# Altium footprint library ref-packages-longpad.PCBLIB: 1527 footprints (part 28 of 103)
Each footprint in its own frame and in the unit in brackets; x right, y up, seen from the top. Pads: shape width x height; smd on the part's side, far side on the other; paste and mask are expansions set on the pad; w line width, h text height; cw(c..) or ccw(c..) is an arc to the next point about the centre after c.
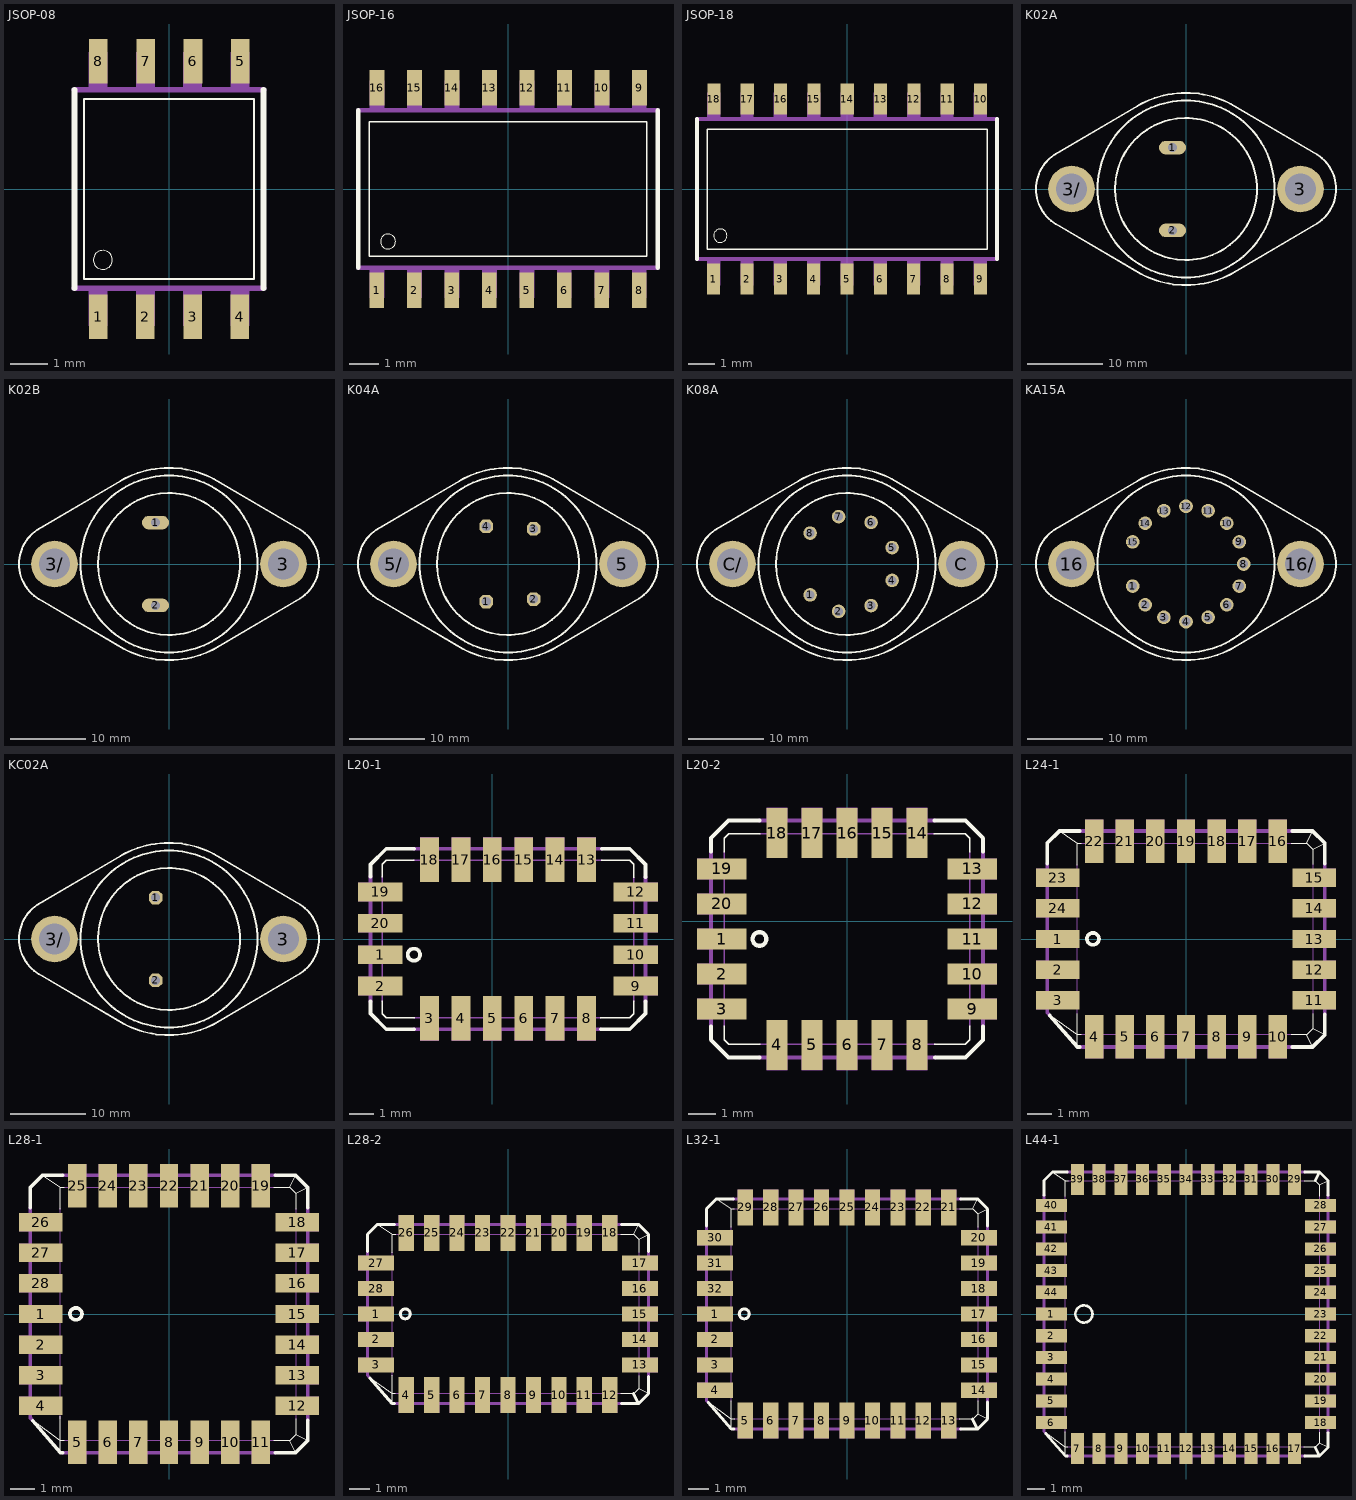
[diagram p27: the footprints below, top view; thin cyan lines are the x and y axes]

## JSOP-08 [mil]
pads (8):
  rect 19.69x47.24 smd: 1(-75,-135) 2(-25,-135) 3(25,-135) 4(75,-135) 5(75.32,135) 6(25.32,135) 7(-24.69,135) 8(-74.69,135)
Top Overlay:
  circle w0: c-70,-75 r10
  lines w2: -90,-95 90,-95 90,95 -90,95 -90,-95
  lines w6: -100,-105 -100,105 ; 100,-105 100,105
Mechanical 16:
  rectangle: -85,105 -65,145
  rectangle: -35,105 -15,145
  rectangle: 15,105 35,145
  rectangle: 65,105 85,145
  rectangle: -85,-145 -65,-105
  rectangle: -35,-145 -15,-105
  rectangle: 15,-145 35,-105
  rectangle: 65,-145 85,-105
  lines w6: -100,-105 100,-105 ; -100,105 100,105

## JSOP-16 [mil]
pads (16):
  rect 19.69x47.24 smd: 1(-175,-135) 2(-125,-135) 3(-75,-135) 4(-25,-135) 5(25,-135) 6(75,-135) 7(125,-135) 8(175,-135) 9(175.32,135) 10(125.32,135) 11(75.32,135) 12(25.32,135) 13(-24.69,135) 14(-74.69,135) 15(-124.69,135) 16(-174.69,135)
Top Overlay:
  circle w0: c-160,-70 r10
  lines w2: -185,-90 185,-90 185,90 -185,90 -185,-90
  lines w6: -200,-105 -200,105 ; 200,-105 200,105
Mechanical 16:
  rectangle: -185,105 -165,145
  rectangle: -135,105 -115,145
  rectangle: -85,105 -65,145
  rectangle: -35,105 -15,145
  rectangle: 15,105 35,145
  rectangle: 65,105 85,145
  rectangle: 115,105 135,145
  rectangle: 165,105 185,145
  rectangle: -185,-145 -165,-105
  rectangle: -135,-145 -115,-105
  rectangle: -85,-145 -65,-105
  rectangle: -35,-145 -15,-105
  rectangle: 15,-145 35,-105
  rectangle: 65,-145 85,-105
  rectangle: 115,-145 135,-105
  rectangle: 165,-145 185,-105
  lines w6: -200,-105 200,-105 ; -200,105 200,105

## JSOP-18 [mil]
pads (18):
  rect 19.69x47.24 smd: 1(-200,-135) 2(-150,-135) 3(-100,-135) 4(-50,-135) 5(0,-135) 6(50,-135) 7(100,-135) 8(150,-135) 9(200,-135) 10(200.32,135) 11(150.32,135) 12(100.32,135) 13(50.32,135) 14(0.32,135) 15(-49.69,135) 16(-99.69,135) 17(-149.69,135) 18(-199.69,135)
Top Overlay:
  circle w0: c-190,-70 r10
  lines w2: -210,-90 210,-90 210,90 -210,90 -210,-90
  lines w6: -225,-105 -225,105 ; 225,-105 225,105
Mechanical 16:
  rectangle: -210,105 -190,145
  rectangle: -160,105 -140,145
  rectangle: -110,105 -90,145
  rectangle: -60,105 -40,145
  rectangle: -10,105 10,145
  rectangle: 40,105 60,145
  rectangle: 90,105 110,145
  rectangle: 140,105 160,145
  rectangle: 190,105 210,145
  rectangle: -210,-145 -190,-105
  rectangle: -160,-145 -140,-105
  rectangle: -110,-145 -90,-105
  rectangle: -60,-145 -40,-105
  rectangle: -10,-145 10,-105
  rectangle: 40,-145 60,-105
  rectangle: 90,-145 110,-105
  rectangle: 140,-145 160,-105
  rectangle: 190,-145 210,-105
  lines w6: -225,-105 225,-105 ; -225,105 225,105

## K02A [mil]
pads (4):
  oval 141x70.5 hole 47: 1(-70,215) 2(-70,-215)
  round 243 hole 162: 3(595,0) 3/(-595,0)
Top Overlay:
  circle w10: c0,0 r369
  circle w10: c0,0 r460
  lines w10: -680,180 -250,433 ; -679,-181 -234,-442 ; -675.41,-183.35 cw(c-567,0) -780,0 cw(c-567,0) -672.94,184.78 ; -250.86,432.52 cw(c-0.01,0) 0,500 cw(c0.01,-0.01) 235.3,441.18 ; -235.3,-441.18 ccw(c-0.01,0.01) 0,-500 ccw(c0.01,0) 250.86,-432.52 ; 235,441 684,178 ; 251,-433 684,-178 ; 682.54,-178.94 ccw(c567,0) 780,0 ccw(c567,0) 682.54,178.94
Mechanical 16:
  circle w10: c595,0 r85
  circle w10: c-595,0 r85

## K02B [mil]
pads (4):
  oval 141x70.5 hole 47: 1(-70,215) 2(-70,-215)
  round 243 hole 162: 3(595,0) 3/(-595,0)
Top Overlay:
  circle w10: c0,0 r369
  circle w10: c0,0 r460
  lines w10: -680,180 -250,433 ; -679,-181 -234,-442 ; -675.41,-183.35 cw(c-567,0) -780,0 cw(c-567,0) -672.94,184.78 ; -250.86,432.52 cw(c-0.01,0) 0,500 cw(c0.01,-0.01) 235.3,441.18 ; -235.3,-441.18 ccw(c-0.01,0.01) 0,-500 ccw(c0.01,0) 250.86,-432.52 ; 235,441 684,178 ; 251,-433 684,-178 ; 682.54,-178.94 ccw(c567,0) 780,0 ccw(c567,0) 682.54,178.94
Mechanical 16:
  circle w10: c595,0 r85
  circle w10: c-595,0 r85

## K04A [mil]
pads (6):
  oct 70.5x70.5 hole 47: 1(-113.17,-195.75) 2(132.8,-183) 3(132.8,183) 4(-113.17,195.75)
  round 243 hole 162: 5(595,0) 5/(-595,0)
Top Overlay:
  circle w10: c0,0 r369
  circle w10: c0,0 r460
  lines w10: -680,180 -250,433 ; -679,-181 -234,-442 ; -675.41,-183.35 cw(c-567,0) -780,0 cw(c-567,0) -672.94,184.78 ; -250.86,432.52 cw(c-0.01,0) 0,500 cw(c0.01,-0.01) 235.3,441.18 ; -235.3,-441.18 ccw(c-0.01,0.01) 0,-500 ccw(c0.01,0) 250.86,-432.52 ; 235,441 684,178 ; 251,-433 684,-178 ; 682.54,-178.94 ccw(c567,0) 780,0 ccw(c567,0) 682.54,178.94
Mechanical 16:
  circle w10: c595,0 r85
  circle w10: c-595,0 r85

## K08A [mil]
pads (10):
  round 70.5 hole 47: 1(-191.51,-160.7) 2(-43.41,-246.2) 3(125,-216.51) 4(234.92,-85.5) 5(234.92,85.5) 6(125,216.51) 7(-43.41,246.2) 8(-191.51,160.7)
  round 243 hole 162: C(595,0) C/(-595,0)
Top Overlay:
  circle w10: c0,0 r369
  circle w10: c0,0 r460
  lines w10: -680,180 -250,433 ; -679,-181 -234,-442 ; -675.41,-183.35 cw(c-567,0) -780,0 cw(c-567,0) -672.94,184.78 ; -250.86,432.52 cw(c-0.01,0) 0,500 cw(c0.01,-0.01) 235.3,441.18 ; -235.3,-441.18 ccw(c-0.01,0.01) 0,-500 ccw(c0.01,0) 250.86,-432.52 ; 235,441 684,178 ; 251,-433 684,-178 ; 682.54,-178.94 ccw(c567,0) 780,0 ccw(c567,0) 682.54,178.94
Mechanical 16:
  circle w6: c595,0 r85
  circle w6: c-595,0 r85

## KA15A [mil]
pads (17):
  round 70.86 hole 47.24: 1(-277.17,-114.8) 2(-212.13,-212.13) 3(-114.8,-277.17) 4(0,-300) 5(114.8,-277.17) 6(212.13,-212.13) 7(277.17,-114.8) 8(300,0) 9(277.17,114.8) 10(212.13,212.13) 11(114.8,277.17) 12(0,300) 13(-114.8,277.17) 14(-212.13,212.13) 15(-277.17,114.8)
  round 243 hole 162: 16(-595,0) 16/(595,0)
Top Overlay:
  circle w10: c0,0 r460
  lines w10: -680,180 -250,433 ; -679,-181 -234,-442 ; -675.41,-183.35 cw(c-567,0) -780,0 cw(c-567,0) -672.94,184.78 ; -250.86,432.52 cw(c-0.01,0) 0,500 cw(c0.01,-0.01) 235.3,441.18 ; -235.3,-441.18 ccw(c-0.01,0.01) 0,-500 ccw(c0.01,0) 250.86,-432.52 ; 235,441 684,178 ; 251,-433 684,-178 ; 682.54,-178.94 ccw(c567,0) 780,0 ccw(c567,0) 682.54,178.94
Mechanical 16:
  circle w6: c595,0 r85
  circle w6: c-595,0 r85

## KC02A [mil]
pads (4):
  oct 70.5x70.5 hole 47: 1(-70,215) 2(-70,-215)
  round 243 hole 162: 3(595,0) 3/(-595,0)
Top Overlay:
  circle w10: c0,0 r369
  circle w10: c0,0 r460
  lines w10: -680,180 -250,433 ; -679,-181 -234,-442 ; -675.41,-183.35 cw(c-567,0) -780,0 cw(c-567,0) -672.94,184.78 ; -250.86,432.52 cw(c-0.01,0) 0,500 cw(c0.01,-0.01) 235.3,441.18 ; -235.3,-441.18 ccw(c-0.01,0.01) 0,-500 ccw(c0.01,0) 250.86,-432.52 ; 235,441 684,178 ; 251,-433 684,-178 ; 682.54,-178.94 ccw(c567,0) 780,0 ccw(c567,0) 682.54,178.94
Mechanical 16:
  circle w10: c595,0 r85
  circle w10: c-595,0 r85

## L20-1 [mil]
pads (20):
  rect 70.87x29.92 smd: 1(-178.35,-25) 2(-178.35,-75) 9(228.35,-75) 10(228.35,-25) 11(228.35,25) 12(228.35,75) 19(-178.35,75) 20(-178.35,25)
  rect 29.92x70.87 smd: 3(-100,-125.98) 4(-50,-125.98) 5(0,-125.98) 6(50,-125.98) 7(100,-125.98) 8(150,-125.98) 13(150,125.98) 14(100,125.98) 15(50,125.98) 16(0,125.98) 17(-50,125.98) 18(-100,125.98)
Top Overlay:
  lines w2: -175,-98.54 -175,-118.74 -168.74,-125 -123.66,-125 ; -175,98.54 -175,118.74 -168.74,125 -124.53,125 ; 171.57,-125 218.74,-125 225,-118.74 225,-98.54 ; 173.54,125 218.74,125 225,118.74 225,97.56
  lines w6: -193.74,-99.65 -193.74,-118.74 -168.74,-143.74 -124.65,-143.74 ; -193.75,99.66 -193.75,118.75 -168.75,143.75 -124.66,143.75 ; -134.61,-25.16 cw(c-124.77,-25.16) -114.92,-25.16 ; -134.61,-24.84 ccw(c-124.77,-24.84) -114.92,-24.84 ; 172.69,-143.75 218.75,-143.75 243.75,-118.75 243.75,-99.66 ; 174.65,143.74 218.74,143.74 243.74,118.74 243.74,98.66
Mechanical 16:
  rectangle: -114.96,144.88 -85.04,162.6
  rectangle: -64.96,144.88 -35.04,162.6
  rectangle: -14.96,144.88 14.96,162.6
  rectangle: 35.04,144.88 64.96,162.6
  rectangle: 85.04,144.88 114.96,162.6
  rectangle: -114.96,-162.6 -85.04,-144.88
  rectangle: -64.96,-162.6 -35.04,-144.88
  rectangle: -14.96,-162.6 14.96,-144.88
  rectangle: 35.04,-162.6 64.96,-144.88
  rectangle: 85.04,-162.6 114.96,-144.88
  rectangle: 246.06,60.04 263.78,89.96
  rectangle: 246.06,10.04 263.78,39.96
  rectangle: 246.06,-39.96 263.78,-10.04
  rectangle: 246.06,-89.96 263.78,-60.04
  rectangle: -213.78,60.04 -196.06,89.96
  rectangle: -213.78,10.04 -196.06,39.96
  rectangle: -213.78,-39.96 -196.06,-10.04
  rectangle: -213.78,-89.96 -196.06,-60.04
  rectangle: 135.04,144.88 164.96,162.6
  rectangle: 135.04,-162.6 164.96,-144.88
  lines w2: -175,-99.65 -175,99.65 ; -125.63,125 174.65,125 ; -124.65,-125 172.68,-125 ; 225,-99.65 225,98.66
  lines w6: -193.74,-99.65 -193.75,99.66 ; -124.65,-143.74 172.69,-143.75 ; -124.66,143.75 174.65,143.74 ; 37.4,144.88 62.6,144.88 ; 87.4,144.88 112.6,144.88 ; 137.4,144.88 162.6,144.88 ; 243.75,-99.66 243.74,98.66

## L20-2 [mil]
pads (20):
  rect 70.87x29.92 smd: 1(-178.35,-25) 2(-178.35,-75) 3(-178.35,-125) 9(178.35,-125) 10(178.35,-75) 11(178.35,-25) 12(178.35,25) 13(178.35,75) 19(-178.35,75) 20(-178.35,25)
  rect 29.92x70.87 smd: 4(-100,-175.98) 5(-50,-175.98) 6(0,-175.98) 7(50,-175.98) 8(100,-175.98) 14(100,125.98) 15(50,125.98) 16(0,125.98) 17(-50,125.98) 18(-100,125.98)
Top Overlay:
  lines w2: -175,-148.54 -175,-168.74 -168.74,-175 -123.66,-175 ; -175,98.54 -175,118.74 -168.74,125 -123.54,125 ; 123.54,125 168.74,125 175,118.74 175,98.54 ; 124.53,-175 168.74,-175 175,-168.74 175,-148.54
  lines w6: -193.74,-149.65 -193.74,-168.74 -168.74,-193.74 -124.65,-193.74 ; -193.75,99.66 -193.75,118.75 -168.75,143.75 -124.66,143.75 ; -134.61,-25.04 cw(c-124.61,-24.94) -134.61,-24.84 ; -114.92,-25.16 ccw(c-124.77,-25.1) -134.61,-24.84 ; -114.92,-24.92 cw(c-124.77,-24.88) -134.61,-24.84 ; 124.65,143.74 168.74,143.74 193.74,118.74 193.74,99.65 ; 125.64,-193.75 168.75,-193.75 193.75,-168.75 193.75,-149.66
Mechanical 16:
  rectangle: -114.96,144.88 -85.04,162.6
  rectangle: -64.96,144.88 -35.04,162.6
  rectangle: -14.96,144.88 14.96,162.6
  rectangle: 35.04,144.88 64.96,162.6
  rectangle: 85.04,144.88 114.96,162.6
  rectangle: -114.96,-212.6 -85.04,-194.88
  rectangle: -64.96,-212.6 -35.04,-194.88
  rectangle: -14.96,-212.6 14.96,-194.88
  rectangle: 35.04,-212.6 64.96,-194.88
  rectangle: 85.04,-212.6 114.96,-194.88
  rectangle: 196.06,60.04 213.78,89.96
  rectangle: 196.06,10.04 213.78,39.96
  rectangle: 196.06,-39.96 213.78,-10.04
  rectangle: 196.06,-89.96 213.78,-60.04
  rectangle: -213.78,60.04 -196.06,89.96
  rectangle: -213.78,10.04 -196.06,39.96
  rectangle: -213.78,-39.96 -196.06,-10.04
  rectangle: -213.78,-89.96 -196.06,-60.04
  rectangle: -213.78,-89.96 -196.06,-60.04
  rectangle: 196.06,-139.96 213.78,-110.04
  rectangle: -213.78,-139.96 -196.06,-110.04
  lines w2: -175,-149.65 -175,99.65 ; -124.65,-175 125.63,-175 ; -124.65,125 124.65,125 ; 175,-149.65 175,99.65
  lines w6: -193.74,-149.65 -193.75,99.66 ; -124.65,-193.74 125.64,-193.75 ; -124.66,143.75 124.65,143.74 ; 37.4,144.88 62.6,144.88 ; 193.75,-149.66 193.74,99.65

## L24-1 [mil]
pads (24):
  rect 70.87x29.92 smd: 1(-209.45,0) 2(-209.45,-50) 3(-209.45,-100) 11(209.45,-100) 12(209.45,-50) 13(209.45,0) 14(209.45,50) 15(209.45,100) 23(-209.45,100) 24(-209.45,50)
  rect 29.92x70.87 smd: 4(-150,-159.45) 5(-100,-159.45) 6(-50,-159.45) 7(0,-159.45) 8(50,-159.45) 9(100,-159.45) 10(150,-159.45) 16(150,159.45) 17(100,159.45) 18(50,159.45) 19(0,159.45) 20(-50,159.45) 21(-100,159.45) 22(-150,159.45)
Top Overlay:
  lines w2: -223.39,-124.06 -177.17,-156.69 ; -206.69,176.38 -177.17,156.69 ; -177.17,-176.38 -177.17,-156.69 ; -177.17,-121.65 -177.17,-156.69 ; -177.17,120.67 -177.17,156.69 ; -170.67,-156.69 -177.17,-156.69 ; -170.67,156.69 -177.17,156.69 ; 171.65,-156.69 196.85,-156.69 ; 171.65,156.69 196.85,156.69 ; 206.69,-176.38 196.85,-156.69 ; 206.69,-121.65 206.69,-146.85 ; 206.69,121.65 206.69,146.85 ; 206.69,176.38 196.85,156.69 ; 226.38,-156.69 206.69,-146.85 ; 226.38,156.69 206.69,146.85 ; 196.85,-156.69 206.69,-146.85 ; 196.85,156.69 206.69,146.85
  lines w6: -226.38,123.23 -226.38,156.69 -206.69,176.38 -173.23,176.38 ; -222.44,-125 -177.17,-176.38 -173.23,-176.38 ; -161.81,0.16 cw(c-152.31,0.26) -161.81,0.35 ; -142.13,0.04 ccw(c-151.97,0.1) -161.81,0.35 ; -142.13,0.28 cw(c-151.97,0.32) -161.81,0.35 ; 173.23,-176.38 206.69,-176.38 226.38,-156.69 226.38,-123.23 ; 173.23,176.38 206.69,176.38 226.38,156.69 226.38,123.23
Mechanical 16:
  rectangle: -164.96,176.38 -135.04,194.88
  rectangle: -114.96,176.38 -85.04,194.88
  rectangle: -64.96,176.38 -35.04,194.88
  rectangle: -14.96,176.38 14.96,194.88
  rectangle: 35.04,176.38 64.96,194.88
  rectangle: 85.04,176.38 114.96,194.88
  rectangle: 135.04,176.38 164.96,194.88
  rectangle: 226.38,85.04 244.88,114.96
  rectangle: 226.38,35.04 244.88,64.96
  rectangle: 226.38,-14.96 244.88,14.96
  rectangle: 226.38,-64.96 244.88,-35.04
  rectangle: 226.38,-114.96 244.88,-85.04
  rectangle: -164.96,-194.88 -135.04,-176.38
  rectangle: -114.96,-194.88 -85.04,-176.38
  rectangle: -64.96,-194.88 -35.04,-176.38
  rectangle: -14.96,-194.88 14.96,-176.38
  rectangle: 35.04,-194.88 64.96,-176.38
  rectangle: 85.04,-194.88 114.96,-176.38
  rectangle: 135.04,-194.88 164.96,-176.38
  rectangle: -244.88,85.04 -226.38,114.96
  rectangle: -244.88,35.04 -226.38,64.96
  rectangle: -244.88,-14.96 -226.38,14.96
  rectangle: -244.88,-64.96 -226.38,-35.04
  rectangle: -244.88,-114.96 -226.38,-85.04
  lines w2: -177.17,-121.65 -177.17,120.87 ; -170.87,-156.69 171.85,-156.69 ; -170.71,156.69 172.83,156.69 ; 206.69,-121.85 206.69,121.85
  lines w6: -226.38,-119.96 -226.38,123.66 ; -226.18,-120.28 -222.44,-125 ; -173.66,176.38 173.66,176.38 ; -173.07,-176.38 173.58,-176.38 ; 226.38,-123.66 226.38,123.66

## L28-1 [mil]
pads (28):
  rect 70.87x29.92 smd: 1(-209.45,0) 2(-209.45,-50) 3(-209.45,-100) 4(-209.45,-150) 12(209.45,-150) 13(209.45,-100) 14(209.45,-50) 15(209.45,0) 16(209.45,50) 17(209.45,100) 18(209.45,150) 26(-209.45,150) 27(-209.45,100) 28(-209.45,50)
  rect 29.92x70.87 smd: 5(-150,-209.45) 6(-100,-209.45) 7(-50,-209.45) 8(0,-209.45) 9(50,-209.45) 10(100,-209.45) 11(150,-209.45) 19(150,209.45) 20(100,209.45) 21(50,209.45) 22(0,209.45) 23(-50,209.45) 24(-100,209.45) 25(-150,209.45)
Top Overlay:
  lines w2: -222.6,-173.27 -177.17,-206.69 ; -206.69,226.38 -177.17,206.69 ; -177.17,-226.38 -177.17,-206.69 ; -177.17,-166.73 -177.17,-206.69 ; -177.17,171.26 -177.17,206.69 ; -171.26,-206.69 -177.17,-206.69 ; -171.26,206.69 -177.17,206.69 ; 171.26,-206.69 196.85,-206.69 ; 171.26,206.69 196.85,206.69 ; 206.69,-226.38 196.85,-206.69 ; 206.69,-171.26 206.69,-196.85 ; 206.69,171.26 206.69,196.85 ; 206.69,226.38 196.85,206.69 ; 226.38,-206.69 206.69,-196.85 ; 226.38,206.69 206.69,196.85 ; 196.85,-206.69 206.69,-196.85 ; 196.85,206.69 206.69,196.85
  lines w6: -226.38,173.23 -226.38,206.69 -206.69,226.38 -173.23,226.38 ; -222.44,-174.21 -177.17,-226.38 -173.23,-226.38 ; -161.81,0.16 cw(c-152.31,0.26) -161.81,0.35 ; -142.13,0.04 ccw(c-151.97,0.1) -161.81,0.35 ; -142.13,0.28 cw(c-151.97,0.32) -161.81,0.35 ; 173.23,-226.38 206.69,-226.38 226.38,-206.69 226.38,-173.23 ; 173.23,226.38 206.69,226.38 226.38,206.69 226.38,173.23
Mechanical 16:
  rectangle: -164.96,226.38 -135.04,244.88
  rectangle: -114.96,226.38 -85.04,244.88
  rectangle: -64.96,226.38 -35.04,244.88
  rectangle: -14.96,226.38 14.96,244.88
  rectangle: 35.04,226.38 64.96,244.88
  rectangle: 85.04,226.38 114.96,244.88
  rectangle: 135.04,226.38 164.96,244.88
  rectangle: 226.38,135.04 244.88,164.96
  rectangle: 226.38,85.04 244.88,114.96
  rectangle: 226.38,35.04 244.88,64.96
  rectangle: 226.38,-14.96 244.88,14.96
  rectangle: 226.38,-64.96 244.88,-35.04
  rectangle: 226.38,-114.96 244.88,-85.04
  rectangle: 226.38,-164.96 244.88,-135.04
  rectangle: -164.96,-244.88 -135.04,-226.38
  rectangle: -114.96,-244.88 -85.04,-226.38
  rectangle: -64.96,-244.88 -35.04,-226.38
  rectangle: -14.96,-244.88 14.96,-226.38
  rectangle: 35.04,-244.88 64.96,-226.38
  rectangle: 85.04,-244.88 114.96,-226.38
  rectangle: 135.04,-244.88 164.96,-226.38
  rectangle: -244.88,135.04 -226.38,164.96
  rectangle: -244.88,85.04 -226.38,114.96
  rectangle: -244.88,35.04 -226.38,64.96
  rectangle: -244.88,-14.96 -226.38,14.96
  rectangle: -244.88,-64.96 -226.38,-35.04
  rectangle: -244.88,-114.96 -226.38,-85.04
  rectangle: -244.88,-164.96 -226.38,-135.04
  lines w2: -177.17,-171.06 -177.17,172.24 ; -174.25,-206.69 171.85,-206.69 ; -172.28,206.69 171.85,206.69 ; 206.69,-171.85 206.69,171.85
  lines w6: -226.38,-169.96 -226.38,173.23 ; -226.38,-169.88 -222.44,-174.21 ; -173.23,-226.38 173.23,-226.38 ; -173.23,226.38 173.23,226.38 ; 226.38,-173.23 226.38,173.23

## L28-2 [mil]
pads (28):
  rect 70.87x29.92 smd: 1(-259.45,0) 2(-259.45,-50) 3(-259.45,-100) 13(259.45,-100) 14(259.45,-50) 15(259.45,0) 16(259.45,50) 17(259.45,100) 27(-259.45,100) 28(-259.45,50)
  rect 29.92x70.87 smd: 4(-200,-159.45) 5(-150,-159.45) 6(-100,-159.45) 7(-50,-159.45) 8(0,-159.45) 9(50,-159.45) 10(100,-159.45) 11(150,-159.45) 12(200,-159.45) 18(200,159.45) 19(150,159.45) 20(100,159.45) 21(50,159.45) 22(0,159.45) 23(-50,159.45) 24(-100,159.45) 25(-150,159.45) 26(-200,159.45)
Top Overlay:
  lines w2: -272.24,-125.04 -227.17,-156.69 ; -256.69,176.38 -227.17,156.69 ; -227.17,-176.38 -227.17,-156.69 ; -227.17,-120.67 -227.17,-156.69 ; -227.17,120.67 -227.17,156.69 ; -221.65,-156.69 -227.17,-156.69 ; -220.67,156.69 -227.17,156.69 ; 221.65,-156.69 246.85,-156.69 256.69,-146.85 ; 221.65,156.69 246.85,156.69 ; 256.69,-121.65 256.69,-146.85 ; 256.69,121.65 256.69,146.85 ; 256.69,176.38 246.85,156.69 ; 276.38,-156.69 256.69,-146.85 ; 276.38,156.69 256.69,146.85 ; 246.85,156.69 256.69,146.85
  lines w6: -276.38,123.23 -276.38,156.69 -256.69,176.38 -223.23,176.38 ; -271.65,-125.98 -227.17,-176.38 -223.23,-176.38 ; -211.81,0.04 cw(c-201.97,0.04) -192.13,0.28 ; -211.81,0.35 ccw(c-201.97,0.32) -192.13,0.28 ; -192.13,0.04 ccw(c-202.13,0.16) -192.13,0.28 ; 223.23,-176.38 256.69,-176.38 ; 223.23,176.38 256.69,176.38 276.38,156.69 276.38,123.23 ; 246.85,-156.69 256.69,-176.38 ; 276.38,-123.23 276.38,-156.69 256.69,-176.38
Mechanical 16:
  rectangle: -214.96,176.38 -185.04,194.88
  rectangle: -164.96,176.38 -135.04,194.88
  rectangle: -114.96,176.38 -85.04,194.88
  rectangle: -64.96,176.38 -35.04,194.88
  rectangle: -14.96,176.38 14.96,194.88
  rectangle: 35.04,176.38 64.96,194.88
  rectangle: 85.04,176.38 114.96,194.88
  rectangle: 276.38,85.04 294.88,114.96
  rectangle: 276.38,35.04 294.88,64.96
  rectangle: 276.38,-14.96 294.88,14.96
  rectangle: 276.38,-64.96 294.88,-35.04
  rectangle: 276.38,-114.96 294.88,-85.04
  rectangle: -214.96,-194.88 -185.04,-176.38
  rectangle: -164.96,-194.88 -135.04,-176.38
  rectangle: -114.96,-194.88 -85.04,-176.38
  rectangle: -64.96,-194.88 -35.04,-176.38
  rectangle: -14.96,-194.88 14.96,-176.38
  rectangle: 35.04,-194.88 64.96,-176.38
  rectangle: 85.04,-194.88 114.96,-176.38
  rectangle: -294.88,85.04 -276.38,114.96
  rectangle: -294.88,35.04 -276.38,64.96
  rectangle: -294.88,-14.96 -276.38,14.96
  rectangle: -294.88,-64.96 -276.38,-35.04
  rectangle: -294.88,-114.96 -276.38,-85.04
  rectangle: 135.04,176.38 164.96,194.88
  rectangle: 185.04,176.38 214.96,194.88
  rectangle: 135.04,-194.88 164.96,-176.38
  rectangle: 185.04,-194.88 214.96,-176.38
  lines w2: -227.17,-121.18 -227.17,121.46 ; -222.68,-156.69 221.85,-156.69 ; -221.42,156.69 221.85,156.69 ; 256.69,-121.85 256.69,121.85
  lines w6: -276.38,-119.96 -276.38,123.66 ; -276.38,-119.88 -271.65,-125.98 ; -223.66,176.38 222.68,176.38 ; -223.15,-176.38 223.66,-176.38 ; 276.38,-123.66 276.38,123.66

## L32-1 [mil]
pads (32):
  rect 70.87x29.92 smd: 1(-259.45,0) 2(-259.45,-50) 3(-259.45,-100) 4(-259.45,-150) 14(259.45,-150) 15(259.45,-100) 16(259.45,-50) 17(259.45,0) 18(259.45,50) 19(259.45,100) 20(259.45,150) 30(-259.45,150) 31(-259.45,100) 32(-259.45,50)
  rect 29.92x70.87 smd: 5(-200,-209.45) 6(-150,-209.45) 7(-100,-209.45) 8(-50,-209.45) 9(0,-209.45) 10(50,-209.45) 11(100,-209.45) 12(150,-209.45) 13(200,-209.45) 21(200,209.45) 22(150,209.45) 23(100,209.45) 24(50,209.45) 25(0,209.45) 26(-50,209.45) 27(-100,209.45) 28(-150,209.45) 29(-200,209.45)
Top Overlay:
  lines w2: -273.98,-172.72 -227.17,-206.69 ; -256.69,226.38 -227.17,206.69 ; -227.17,-226.38 -227.17,-206.69 ; -227.17,-170.71 -227.17,-206.69 ; -227.17,170.71 -227.17,206.69 ; -221.69,206.69 -227.17,206.69 ; -220.71,-206.69 -227.17,-206.69 ; 220.71,-206.69 246.85,-206.69 256.69,-196.85 ; 221.69,206.69 246.85,206.69 ; 256.69,-170.71 256.69,-196.85 ; 256.69,170.71 256.69,196.85 ; 256.69,226.38 246.85,206.69 ; 276.38,-206.69 256.69,-196.85 ; 276.38,206.69 256.69,196.85 ; 246.85,206.69 256.69,196.85
  lines w6: -276.38,173.27 -276.38,206.69 -256.69,226.38 -223.27,226.38 ; -272.64,-174.21 -227.17,-226.38 -222.28,-226.38 ; -211.81,0.04 cw(c-201.97,0.04) -192.13,0.28 ; -211.81,0.35 ccw(c-201.97,0.32) -192.13,0.28 ; -192.13,0.04 ccw(c-202.13,0.16) -192.13,0.28 ; 223.27,-226.38 256.69,-226.38 ; 223.27,226.38 256.69,226.38 276.38,206.69 276.38,173.27 ; 246.85,-206.69 256.69,-226.38 ; 276.38,-173.27 276.38,-206.69 256.69,-226.38
Mechanical 16:
  rectangle: -114.96,226.38 -85.04,244.88
  rectangle: -64.96,226.38 -35.04,244.88
  rectangle: -14.96,226.38 14.96,244.88
  rectangle: 35.04,226.38 64.96,244.88
  rectangle: 85.04,226.38 114.96,244.88
  rectangle: 135.04,226.38 164.96,244.88
  rectangle: 185.04,226.38 214.96,244.88
  rectangle: 276.38,135.04 294.88,164.96
  rectangle: 276.38,85.04 294.88,114.96
  rectangle: 276.38,35.04 294.88,64.96
  rectangle: 276.38,-14.96 294.88,14.96
  rectangle: 276.38,-64.96 294.88,-35.04
  rectangle: 276.38,-114.96 294.88,-85.04
  rectangle: 276.38,-164.96 294.88,-135.04
  rectangle: -214.96,-244.88 -185.04,-226.38
  rectangle: -164.96,-244.88 -135.04,-226.38
  rectangle: -114.96,-244.88 -85.04,-226.38
  rectangle: -64.96,-244.88 -35.04,-226.38
  rectangle: -14.96,-244.88 14.96,-226.38
  rectangle: 35.04,-244.88 64.96,-226.38
  rectangle: 85.04,-244.88 114.96,-226.38
  rectangle: -294.88,135.04 -276.38,164.96
  rectangle: -294.88,85.04 -276.38,114.96
  rectangle: -294.88,35.04 -276.38,64.96
  rectangle: -294.88,-14.96 -276.38,14.96
  rectangle: -294.88,-64.96 -276.38,-35.04
  rectangle: -294.88,-114.96 -276.38,-85.04
  rectangle: -294.88,-164.96 -276.38,-135.04
  rectangle: -164.96,226.38 -135.04,244.88
  rectangle: -214.96,226.38 -185.04,244.88
  rectangle: 135.04,-244.88 164.96,-226.38
  rectangle: 185.04,-244.88 214.96,-226.38
  lines w2: -227.17,-171.06 -227.17,171.46 ; -223.07,206.69 221.85,206.69 ; -221.5,-206.69 221.85,-206.69 ; 256.69,-171.85 256.69,171.85
  lines w6: -276.38,-169.96 -276.38,172.68 ; -276.38,-169.72 -272.64,-174.21 ; -223.66,226.38 223.66,226.38 ; -222.17,-226.38 223.66,-226.38 ; 276.38,-172.68 276.38,173.66

## L44-1 [mil]
pads (44):
  rect 70.87x29.92 smd: 1(-309.45,0) 2(-309.45,-50) 3(-309.45,-100) 4(-309.45,-150) 5(-309.45,-200) 6(-309.45,-250) 18(309.45,-250) 19(309.45,-200) 20(309.45,-150) 21(309.45,-100) 22(309.45,-50) 23(309.45,0) 24(309.45,50) 25(309.45,100) 26(309.45,150) 27(309.45,200) 28(309.45,250) 40(-309.45,250) 41(-309.45,200) 42(-309.45,150) 43(-309.45,100) 44(-309.45,50)
  rect 29.92x70.87 smd: 7(-250,-309.45) 8(-200,-309.45) 9(-150,-309.45) 10(-100,-309.45) 11(-50,-309.45) 12(0,-309.45) 13(50,-309.45) 14(100,-309.45) 15(150,-309.45) 16(200,-309.45) 17(250,-309.45) 29(250,309.45) 30(200,309.45) 31(150,309.45) 32(100,309.45) 33(50,309.45) 34(0,309.45) 35(-50,309.45) 36(-100,309.45) 37(-150,309.45) 38(-200,309.45) 39(-250,309.45)
Top Overlay:
  circle w6: c-234.65,0 r19.69
  lines w2: -322.99,-272.52 -277.17,-306.69 ; -306.69,326.38 -277.17,306.69 ; -277.17,-326.38 -277.17,-306.69 ; -277.17,-271.3 -277.17,-306.69 ; -277.17,270.71 -277.17,306.69 ; -271.69,-306.69 -277.17,-306.69 ; -270.71,306.69 -277.17,306.69 ; 270.71,-306.69 296.85,-306.69 306.69,-296.85 ; 271.69,306.69 296.85,306.69 306.69,296.85 ; 306.69,-271.69 306.69,-296.85 ; 306.69,270.71 306.69,296.85 ; 326.38,-306.69 306.69,-296.85 ; 326.38,306.69 306.69,296.85
  lines w6: -326.38,273.27 -326.38,306.69 -306.69,326.38 -273.27,326.38 ; -322.83,-274.61 -277.17,-326.38 -273.27,-326.38 ; 273.27,-326.38 306.69,-326.38 ; 273.27,326.38 306.69,326.38 ; 296.85,-306.69 306.69,-326.38 ; 296.85,306.69 306.69,326.38 ; 326.38,-273.27 326.38,-306.69 306.69,-326.38 ; 326.38,273.27 326.38,306.69 306.69,326.38
Mechanical 16:
  rectangle: -114.96,326.38 -85.04,344.88
  rectangle: -64.96,326.38 -35.04,344.88
  rectangle: -14.96,326.38 14.96,344.88
  rectangle: 35.04,326.38 64.96,344.88
  rectangle: 85.04,326.38 114.96,344.88
  rectangle: 135.04,326.38 164.96,344.88
  rectangle: 185.04,326.38 214.96,344.88
  rectangle: 326.38,135.04 344.88,164.96
  rectangle: 326.38,85.04 344.88,114.96
  rectangle: 326.38,35.04 344.88,64.96
  rectangle: 326.38,-14.96 344.88,14.96
  rectangle: 326.38,-64.96 344.88,-35.04
  rectangle: 326.38,-114.96 344.88,-85.04
  rectangle: 326.38,-264.96 344.88,-235.04
  rectangle: -214.96,-344.88 -185.04,-326.38
  rectangle: -164.96,-344.88 -135.04,-326.38
  rectangle: -114.96,-344.88 -85.04,-326.38
  rectangle: -64.96,-344.88 -35.04,-326.38
  rectangle: -14.96,-344.88 14.96,-326.38
  rectangle: 35.04,-344.88 64.96,-326.38
  rectangle: 85.04,-344.88 114.96,-326.38
  rectangle: -344.88,135.04 -326.38,164.96
  rectangle: -344.88,85.04 -326.38,114.96
  rectangle: -344.88,35.04 -326.38,64.96
  rectangle: -344.88,-14.96 -326.38,14.96
  rectangle: -344.88,-64.96 -326.38,-35.04
  rectangle: -344.88,-114.96 -326.38,-85.04
  rectangle: -344.88,-264.96 -326.38,-235.04
  rectangle: -164.96,326.38 -135.04,344.88
  rectangle: -214.96,326.38 -185.04,344.88
  rectangle: 135.04,-344.88 164.96,-326.38
  rectangle: 185.04,-344.88 214.96,-326.38
  rectangle: -344.88,185.04 -326.38,214.96
  rectangle: -344.88,235.04 -326.38,264.96
  rectangle: -344.88,-164.96 -326.38,-135.04
  rectangle: -344.88,-214.96 -326.38,-185.04
  rectangle: 235.04,-344.88 264.96,-326.38
  rectangle: 326.38,-214.96 344.88,-185.04
  rectangle: 326.38,-164.96 344.88,-135.04
  rectangle: 326.38,185.04 344.88,214.96
  rectangle: 326.38,235.04 344.88,264.96
  rectangle: 235.04,326.38 264.96,344.88
  rectangle: -264.96,326.38 -235.04,344.88
  rectangle: -264.96,-344.88 -235.04,-326.38
  lines w2: -277.17,-272.24 -277.17,270.67 ; -271.97,-306.69 271.85,-306.69 ; -270.98,306.69 271.85,306.69 ; 306.69,-271.85 306.69,271.85
  lines w6: -326.38,-270.12 -322.83,-274.61 ; -326.38,-269.96 -326.38,272.68 ; -273.66,326.38 272.68,326.38 ; -273.07,-326.38 273.66,-326.38 ; 326.38,-272.68 326.38,272.68